# Altium footprint library ICs And Semiconductors SMD.PcbLib: 943 footprints (part 13 of 60)
Each footprint in its own frame and in the unit in brackets; x right, y up, seen from the top. Pads: shape width x height; smd on the part's side, far side on the other; paste and mask are expansions set on the pad; w line width, h text height; cw(c..) or ccw(c..) is an arc to the next point about the centre after c.
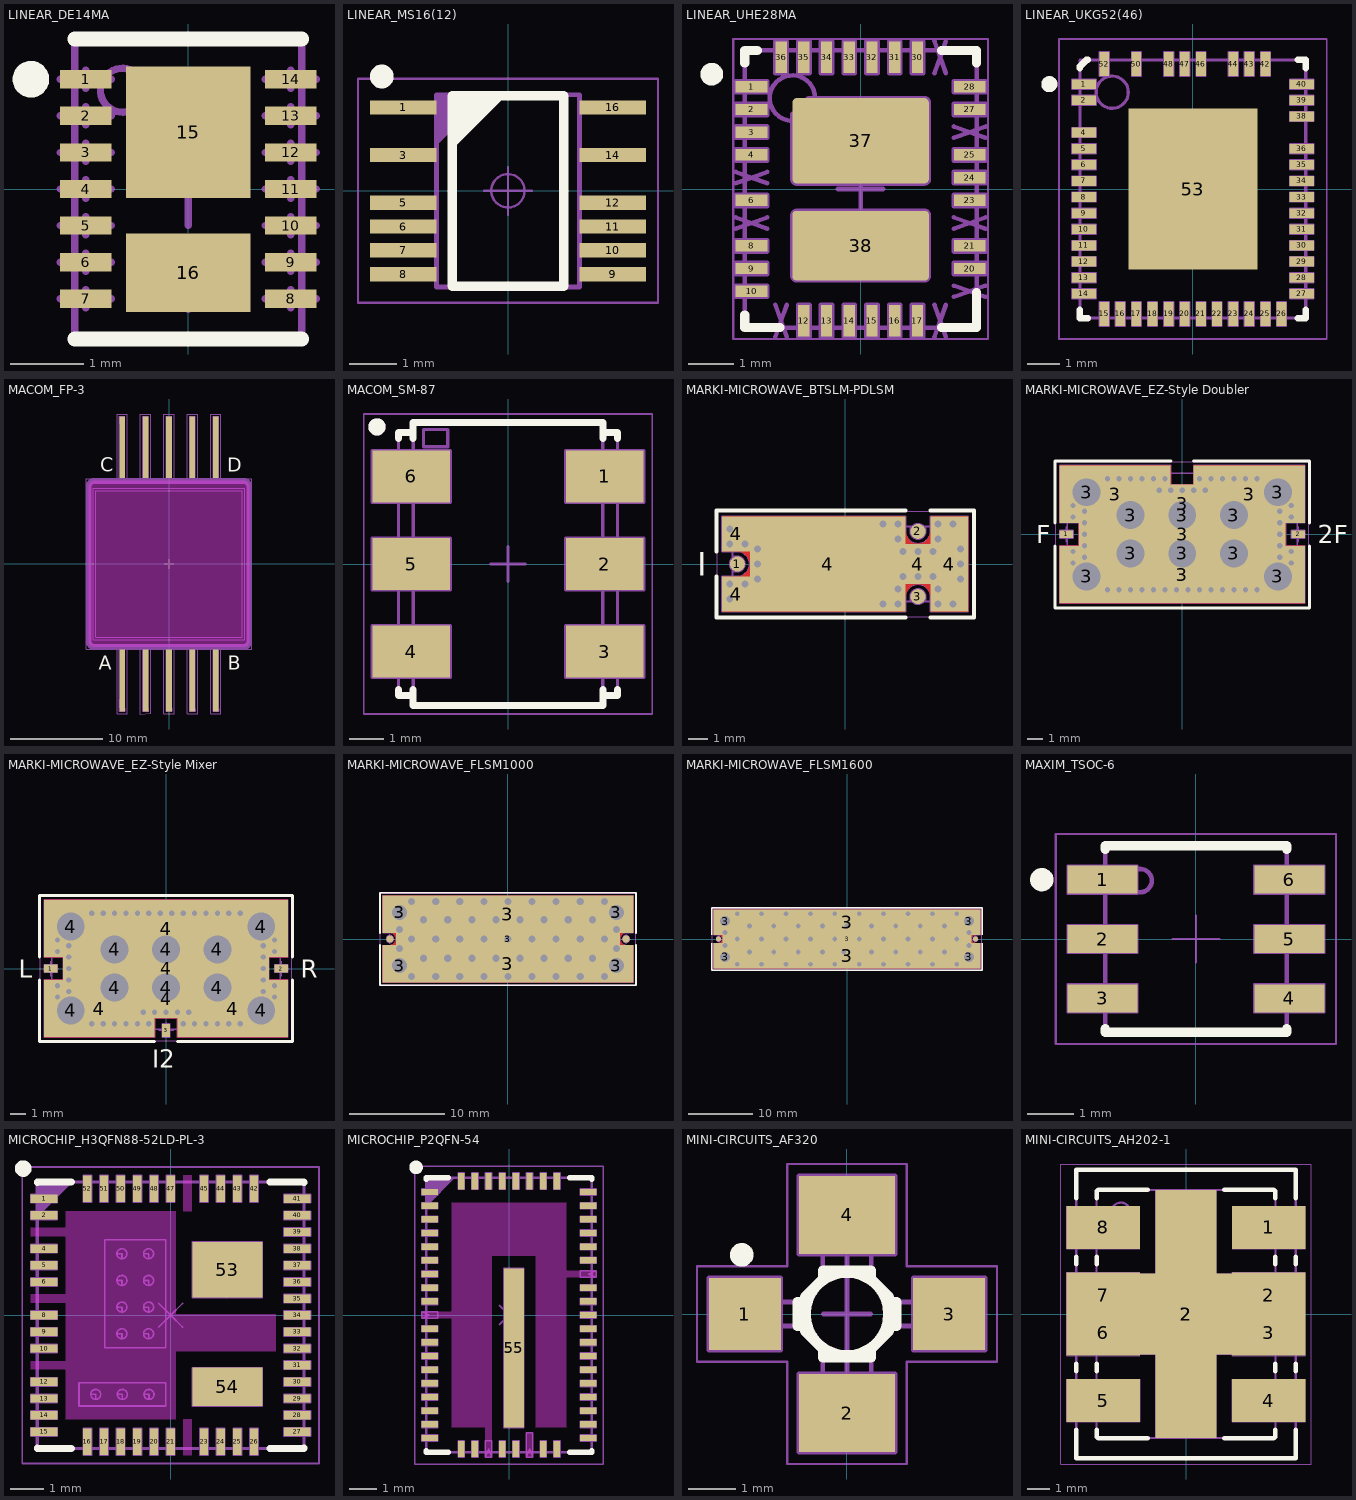
[diagram p12: the footprints below, top view; thin cyan lines are the x and y axes]

## LINEAR_DE14MA [mm] "DFN, 14-Leads, Body 3x4mm, Pitch 0.50mm, LINEAR DE14MA Package"
height 0.8
pads (16):
  rect 0.7x0.25 smd: 1(-1.4,1.5) 2(-1.4,1) 3(-1.4,0.5) 4(-1.4,0) 5(-1.4,-0.5) 6(-1.4,-1) 7(-1.4,-1.5) 8(1.4,-1.5) 9(1.4,-1) 10(1.4,-0.5) 11(1.4,0) 12(1.4,0.5) 13(1.4,1) 14(1.4,1.5)
  rect 1.7x1.8 smd: 15(0,0.778)
  rect 1.7x1.07 smd: 16(0,-1.145)
Top Overlay:
  circle w0.25: c-2.15,1.5 r0.125
  lines w0.2: -1.55,-2.05 1.55,-2.05 ; -1.55,2.05 1.55,2.05
Mechanical 8:
  lines w0.1: -1.75,-1.5 -1.4,-1.5 ; -1.75,-1 -1.4,-1 ; -1.75,-0.5 -1.4,-0.5 ; -1.75,0 -1.4,0 ; -1.75,0.5 -1.4,0.5 ; -1.75,1 -1.4,1 ; -1.75,1.5 -1.4,1.5 ; -1.4,-1.625 -1.4,-1.5 ; -1.4,-1.375 -1.4,-1.5 ; -1.4,-1.125 -1.4,-1 ; -1.4,-0.875 -1.4,-1 ; -1.4,-0.625 -1.4,-0.5 ; -1.4,-0.375 -1.4,-0.5 ; -1.4,-0.125 -1.4,0 ; -1.4,0.125 -1.4,0 ; -1.4,0.375 -1.4,0.5 ; -1.4,0.625 -1.4,0.5 ; -1.4,0.875 -1.4,1 ; -1.4,1.125 -1.4,1 ; -1.4,1.375 -1.4,1.5 ; -1.4,1.625 -1.4,1.5 ; -1.05,-1.5 -1.4,-1.5 ; -1.05,-1 -1.4,-1 ; -1.05,-0.5 -1.4,-0.5 ; -1.05,0 -1.4,0 ; -1.05,0.5 -1.4,0.5 ; -1.05,1 -1.4,1 ; -1.05,1.5 -1.4,1.5 ; -0.5,-1.145 0,-1.145 ; -0.5,0 0,0 ; -0.5,0.778 0,0.778 ; 0,-1.645 0,-1.145 ; 0,-0.5 0,0 ; 0,0.5 0,0 ; 0,1.278 0,0.778 ; 0.5,-1.145 0,-1.145 ; 0.5,0 0,0 ; 0.5,0.778 0,0.778 ; 1.05,-1.5 1.4,-1.5 ; 1.05,-1 1.4,-1 ; 1.05,-0.5 1.4,-0.5 ; 1.05,0 1.4,0 ; 1.05,0.5 1.4,0.5 ; 1.05,1 1.4,1 ; 1.05,1.5 1.4,1.5 ; 1.4,-1.625 1.4,-1.5 ; 1.4,-1.375 1.4,-1.5 ; 1.4,-1.125 1.4,-1 ; 1.4,-0.875 1.4,-1 ; 1.4,-0.625 1.4,-0.5 ; 1.4,-0.375 1.4,-0.5 ; 1.4,-0.125 1.4,0 ; 1.4,0.125 1.4,0 ; 1.4,0.375 1.4,0.5 ; 1.4,0.625 1.4,0.5 ; 1.4,0.875 1.4,1 ; 1.4,1.125 1.4,1 ; 1.4,1.375 1.4,1.5 ; 1.4,1.625 1.4,1.5 ; 1.75,-1.5 1.4,-1.5 ; 1.75,-1 1.4,-1 ; 1.75,-0.5 1.4,-0.5 ; 1.75,0 1.4,0 ; 1.75,0.5 1.4,0.5 ; 1.75,1 1.4,1 ; 1.75,1.5 1.4,1.5
Mechanical 14:
  circle w0.1: c-0.9,1.35 r0.3
  lines w0.1: -1.55,-2.05 1.55,-2.05 1.55,2.05 -1.55,2.05 -1.55,-2.05
3D body "LINEAR_DE14MA.stp": height 0.8, standoff 0, extent -1.55,-2.05 1.55,2.05

## LINEAR_MS16(12) [mm] "SOP, 0.50mm Pitch; 16 Pins with 4 Pins Removed, 3.00mm W X 4.039mm L X 1.10mm H Body, IPC Medium Density"
height 1.1
pads (12):
  rect 1.4x0.3 smd: 1(-2.2,1.75) 3(-2.2,0.75) 5(-2.2,-0.25) 6(-2.2,-0.75) 7(-2.2,-1.25) 8(-2.2,-1.75) 9(2.2,-1.75) 10(2.2,-1.25) 11(2.2,-0.75) 12(2.2,-0.25) 14(2.2,0.75) 16(2.2,1.75)
Top Overlay:
  circle w0.25: c-2.65,2.4 r0.125
  lines w0.2: -1.175,1 -0.175,2 ; -1.175,1.2 -0.375,2 ; -1.175,1.4 -0.575,2 ; -1.175,1.6 -0.775,2 ; -1.175,1.8 -0.975,2 ; -1.175,-2 1.175,-2 1.175,2 -1.175,2 -1.175,-2
Mechanical 14:
  lines w0.1: -1.5,1.019 -0.5,2.019 ; -1.5,1.12 -0.6,2.019 ; -1.5,1.219 -0.7,2.019 ; -1.5,1.32 -0.8,2.019 ; -1.5,1.419 -0.9,2.019 ; -1.5,1.519 -1,2.019 ; -1.5,1.62 -1.1,2.019 ; -1.5,1.719 -1.2,2.019 ; -1.5,1.82 -1.3,2.019 ; -1.5,1.919 -1.4,2.019 ; -1.5,-2.019 1.5,-2.019 1.5,2.019 -1.5,2.019 -1.5,-2.019
Mechanical 15:
  circle w0.05: c0,0 r0.35
  lines w0.05: -0.5,0 0.5,0 ; 0,-0.5 0,0.5 ; -3.15,-2.35 3.15,-2.35 3.15,2.35 -3.15,2.35 -3.15,-2.35
3D body "LINEAR_MS16(12).stp": height 1.1, standoff 0, extent -2.466,-2.07 2.466,2.07

## LINEAR_UHE28MA [mm] "36-Lead Plastic QFN (5mm × 6mm), LINEAR UHE Package Variation: UHE28MA"
height 0.8
pads (30):
  rect 0.7x0.25 smd: 1(-2.4,2.25) 2(-2.4,1.75) 3(-2.4,1.25) 4(-2.4,0.75) 6(-2.4,-0.25) 8(-2.4,-1.25) 9(-2.4,-1.75) 10(-2.4,-2.25) 20(2.4,-1.75) 21(2.4,-1.25) 23(2.4,-0.25) 24(2.4,0.25) 25(2.4,0.75) 27(2.4,1.75) 28(2.4,2.25)
  rect 0.25x0.7 smd: 12(-1.25,-2.9) 13(-0.75,-2.9) 14(-0.25,-2.9) 15(0.25,-2.9) 16(0.75,-2.9) 17(1.25,-2.9) 30(1.25,2.9) 31(0.75,2.9) 32(0.25,2.9) 33(-0.25,2.9) 34(-0.75,2.9) 35(-1.25,2.9) 36(-1.75,2.9)
  rrect10% 3x1.88 smd: 37(0,1.06)
  rrect10% 3x1.53 smd: 38(0,-1.245)
Top Overlay:
  circle w0.25: c-3.275,2.525 r0.125
  lines w0.2: -2.55,-2.775 -2.55,-3.05 -1.775,-3.05 ; -2.55,2.775 -2.55,3.05 -2.275,3.05 ; 1.775,-3.05 2.55,-3.05 2.55,-2.275 ; 1.775,3.05 2.55,3.05 2.55,2.775
Mechanical 8:
  drawing of 284 lines, arcs and shapes, not listed
Mechanical 14:
  circle w0.1: c-1.5,2 r0.5
  lines w0.1: -2.55,-3.05 -2.55,3.05 2.55,3.05 2.55,-3.05 -2.55,-3.05
Mechanical 15:
  lines w0.05: -2.8,-3.3 2.8,-3.3 2.8,3.3 -2.8,3.3 -2.8,-3.3
3D body "LINEAR_UHE28MA.stp": height 0.8, standoff 0, extent -2.55,-3.05 2.55,3.05

## LINEAR_UKG52(46) [mm] "QFN, 0.50mm Pitch, Rectangular, 47 Pin, 8.5mm L X 7.5mm W X 0.8mm H Body (w/thermal tab 3.9 X 4.9mm), LINEAR UKG52(46) Package"
height 0.8
pads (47):
  rect 0.75x0.3 smd: 1(-3.375,3.25) 2(-3.375,2.75) 4(-3.375,1.75) 5(-3.375,1.25) 6(-3.375,0.75) 7(-3.375,0.25) 8(-3.375,-0.25) 9(-3.375,-0.75) 10(-3.375,-1.25) 11(-3.375,-1.75) 12(-3.375,-2.25) 13(-3.375,-2.75) 14(-3.375,-3.25) 27(3.375,-3.25) 28(3.375,-2.75) 29(3.375,-2.25) 30(3.375,-1.75) 31(3.375,-1.25) 32(3.375,-0.75) 33(3.375,-0.25) 34(3.375,0.25) 35(3.375,0.75) 36(3.375,1.25) 38(3.375,2.25) 39(3.375,2.75) 40(3.375,3.25)
  rect 0.3x0.75 smd: 15(-2.75,-3.875) 16(-2.25,-3.875) 17(-1.75,-3.875) 18(-1.25,-3.875) 19(-0.75,-3.875) 20(-0.25,-3.875) 21(0.25,-3.875) 22(0.75,-3.875) 23(1.25,-3.875) 24(1.75,-3.875) 25(2.25,-3.875) 26(2.75,-3.875) 42(2.25,3.875) 43(1.75,3.875) 44(1.25,3.875) 46(0.25,3.875) 47(-0.25,3.875) 48(-0.75,3.875) 50(-1.75,3.875) 52(-2.75,3.875)
  rect 4x5 smd: 53(0,0)
Top Overlay:
  circle w0.25: c-4.45,3.25 r0.125
  lines w0.2: -3.5,-3.75 -3.5,-4 -3.25,-4 ; -3.5,3.75 -3.5,3.8 -3.3,4 -3.25,4 ; 3.25,-4 3.5,-4 3.5,-3.75 ; 3.25,4 3.5,4 3.5,3.75
Top Paste:
  region: -1.19,-1.95 1.19,-1.95 1.19,-0.27 -1.19,-0.27
  region: -1.19,0.27 1.19,0.27 1.19,1.95 -1.19,1.95
Mechanical 8:
  drawing of 276 lines, arcs and shapes, not listed
Mechanical 14:
  circle w0.1: c-2.5,3 r0.5
  lines w0.1: -3.5,-4 3.5,-4 3.5,4 -3.5,4 -3.5,-4
Mechanical 15:
  circle w0.05: c0,0 r0.35
  lines w0.05: -0.5,0 0.5,0 ; 0,-0.5 0,0.5 ; -4.15,-4.65 4.15,-4.65 4.15,4.65 -4.15,4.65 -4.15,-4.65
3D body "LINEAR_UKG52(46).stp": height 0.8, standoff 0, extent -3.5,-4 3.5,4

## MACOM_FP-3 [mm] "MACOM Case Style FP-3 - Body W 15.9 x L 15.9 H 3.8mm"
height 3.8
pads (10):
  rect 0.6x6.7 smd: 1(-5.08,12.65) 2(-2.54,12.65) 3(0,12.65) 4(2.54,12.65) 5(5.08,12.65) 6(-5.08,-12.65) 7(-2.54,-12.65) 8(0,-12.65) 9(2.54,-12.65) 10(5.08,-12.65)
Top Overlay:
  text "A" at -7.625,-11.5 h1.5
  text "B" at 6.35,-11.5 h1.5
  text "C" at -7.44,10 h1.5
  text "D" at 6.307,10 h1.5
Keep-Out Layer:
  board cut-out: -8.1,-9 -8.219,-9 -8.44,-8.909 -8.609,-8.74 -8.7,-8.519 -8.7,-8.4 -8.7,8.4 -8.7,8.519 -8.609,8.74 -8.44,8.909 -8.219,9 -8.1,9 8.1,9 8.219,9 8.44,8.909 8.609,8.74 8.7,8.519 8.7,8.4 8.7,-8.4 8.7,-8.519 8.609,-8.74 8.44,-8.909 8.219,-9 8.1,-9
Mechanical 1:
  lines w0.635: -8.7,-8.4 ccw(c-8.1,-8.4) -8.1,-9 8.1,-9 ccw(c8.1,-8.4) 8.7,-8.4 8.7,8.4 ccw(c8.1,8.4) 8.1,9 -8.1,9 ccw(c-8.1,8.4) -8.7,8.4 -8.7,-8.4
Mechanical 8:
  lines w0.1: -0.5,0 0,0 ; 0,-0.5 0,0 ; 0,0.5 0,0 ; 0.5,0 0,0 ; -5.38,-16 -4.78,-16 ; -5.38,-16 -5.38,-9.3 -4.78,-9.3 -4.78,-16 ; -5.38,-16 -5.08,-12.65 -4.78,-16 ; -5.38,16 -4.78,16 ; -5.38,16 -5.38,9.3 -4.78,9.3 -4.78,16 ; -5.38,16 -5.08,12.65 -4.78,16 ; -2.84,-16 -2.24,-16 ; -2.84,-16 -2.84,-9.3 -2.24,-9.3 -2.24,-16 ; -2.84,-16 -2.54,-12.65 -2.24,-16 ; -2.84,16 -2.24,16 ; -2.84,16 -2.84,9.3 -2.24,9.3 -2.24,16 ; -2.84,16 -2.54,12.65 -2.24,16 ; -0.3,-16 0.3,-16 ; -0.3,-16 -0.3,-9.3 0.3,-9.3 0.3,-16 ; -0.3,-16 0,-12.65 0.3,-16 ; -0.3,16 0.3,16 ; -0.3,16 -0.3,9.3 0.3,9.3 0.3,16 ; -0.3,16 0,12.65 0.3,16 ; 2.24,-16 2.84,-16 ; 2.24,-16 2.24,-9.3 2.84,-9.3 2.84,-16 ; 2.24,-16 2.54,-12.65 2.84,-16 ; 2.24,16 2.84,16 ; 2.24,16 2.24,9.3 2.84,9.3 2.84,16 ; 2.24,16 2.54,12.65 2.84,16 ; 4.78,-16 5.38,-16 ; 4.78,-16 4.78,-9.3 5.38,-9.3 5.38,-16 ; 4.78,-16 5.08,-12.65 5.38,-16 ; 4.78,16 5.38,16 ; 4.78,16 4.78,9.3 5.38,9.3 5.38,16 ; 4.78,16 5.08,12.65 5.38,16 ; -7.95,-7.95 7.95,-7.95 7.95,7.95 -7.95,7.95 -7.95,-7.95
Mechanical 14:
  lines w0.1: -8.2,-8.2 8.2,-8.2 8.2,8.2 -8.2,8.2 -8.2,-8.2
  text "C" at -5.49,4.25 h1.5
  text "D" at 4.357,4.25 h1.5
  text "A" at -5.675,-5.75 h1.5
  text "B" at 4.4,-5.75 h1.5
Mechanical 15:
  lines w0.05: -8.95,-9.25 -8.95,9.25 -5.63,9.25 -5.63,16.25 -4.53,16.25 -4.53,9.25 -3.09,9.25 -3.09,16.25 -1.99,16.25 -1.99,9.25 -0.55,9.25 -0.55,16.25 0.55,16.25 0.55,9.25 1.99,9.25 1.99,16.25 3.09,16.25 3.09,9.25 4.53,9.25 4.53,16.25 5.63,16.25 5.63,9.25 8.95,9.25 8.95,-9.25 5.63,-9.25 5.63,-16.25 4.53,-16.25 4.53,-9.25 3.09,-9.25 3.09,-16.25 1.99,-16.25 1.99,-9.25 0.55,-9.25 0.55,-16.25 -0.55,-16.25 -0.55,-9.25 -1.995,-9.25 -1.995,-16.175 -3.09,-16.273 -3.09,-9.25 -4.53,-9.25 -4.53,-16.25 -5.63,-16.25 -5.63,-9.25 -8.95,-9.25
Drill Drawing:
  lines w0.1: -7.76,-5.342 -8.7,-5 ; -7.76,-4.658 -8.7,-5 ; -5.342,-8.06 -5,-9 ; -5.342,8.06 -5,9 ; -4.658,-8.06 -5,-9 ; -4.658,8.06 -5,9 ; 0.6,-7.373 7.073,-7.373 8.524,-8.824 ; 7.618,-8.402 8.524,-8.824 ; 7.76,-5.342 8.7,-5 ; 7.76,-4.658 8.7,-5 ; 8.102,-7.918 8.524,-8.824 ; -8.7,-5 8.7,-5 ; -5,-9 -5,9
  text "4x r0.6" at 0.45,-7.075 h1
  text "17.4" at 0.542,-4.791 h1
  text "18" at -5.209,0.792 h1
3D body "MACOM_FP-3.stp": height 2.49, standoff -1.31, extent -8.2,-15.8 8.2,15.8

## MACOM_SM-87 [mm] "MACOM Case Style SM-87 - Body W 6.35 x L 8.20 H 4.85mm"
height 4.85
pads (6):
  rect 2.26x1.5 smd: 1(2.805,2.54) 2(2.805,0) 3(2.805,-2.54) 4(-2.805,-2.54) 5(-2.805,0) 6(-2.805,2.54)
Top Overlay:
  circle w0.25: c-3.8,3.975 r0.125
  lines w0.2: -3.175,-3.64 -3.175,-3.81 -2.75,-3.81 ; -3.175,3.64 -3.175,3.81 -2.75,3.81 ; -2.75,-3.64 -2.75,-4.1 2.75,-4.1 2.75,-3.64 ; -2.75,3.64 -2.75,4.1 2.75,4.1 2.75,3.64 ; 2.75,-3.81 3.175,-3.81 3.175,-3.64 ; 2.75,3.81 3.175,3.81 3.175,3.64
Mechanical 8:
  lines w0.1: -3.305,-2.54 -2.805,-2.54 ; -3.305,0 -2.805,0 ; -3.305,2.54 -2.805,2.54 ; -2.805,-3.04 -2.805,-2.54 ; -2.805,-2.04 -2.805,-2.54 ; -2.805,-0.5 -2.805,0 ; -2.805,0.5 -2.805,0 ; -2.805,2.04 -2.805,2.54 ; -2.805,3.04 -2.805,2.54 ; -2.305,-2.54 -2.805,-2.54 ; -2.305,0 -2.805,0 ; -2.305,2.54 -2.805,2.54 ; -0.5,0 0,0 ; 0,-0.5 0,0 ; 0,0.5 0,0 ; 0.5,0 0,0 ; 2.305,-2.54 2.805,-2.54 ; 2.305,0 2.805,0 ; 2.305,2.54 2.805,2.54 ; 2.805,-3.04 2.805,-2.54 ; 2.805,-2.04 2.805,-2.54 ; 2.805,-0.5 2.805,0 ; 2.805,0.5 2.805,0 ; 2.805,2.04 2.805,2.54 ; 2.805,3.04 2.805,2.54 ; 3.305,-2.54 2.805,-2.54 ; 3.305,0 2.805,0 ; 3.305,2.54 2.805,2.54 ; -3.935,-3.29 -3.935,-1.79 -1.675,-1.79 -1.675,-3.29 -3.935,-3.29 ; -3.935,-0.75 -3.935,0.75 -1.675,0.75 -1.675,-0.75 -3.935,-0.75 ; -3.935,1.79 -3.935,3.29 -1.675,3.29 -1.675,1.79 -3.935,1.79 ; 1.675,-3.29 1.675,-1.79 3.935,-1.79 3.935,-3.29 1.675,-3.29 ; 1.675,-0.75 1.675,0.75 3.935,0.75 3.935,-0.75 1.675,-0.75 ; 1.675,1.79 1.675,3.29 3.935,3.29 3.935,1.79 1.675,1.79
Mechanical 14:
  circle w0.25: c-3.8,3.975 r0.125
  lines w0.1: -3.175,-3.29 ccw(c-3.254,-2.54) -2.75,-3.101 ; -3.175,-1.79 cw(c-3.254,-2.54) -2.75,-1.979 ; -3.175,-0.75 ccw(c-3.254,0) -2.75,-0.561 ; -3.175,0.75 cw(c-3.254,0) -2.75,0.561 ; -3.175,1.79 ccw(c-3.254,2.54) -2.75,1.979 ; -3.175,3.29 cw(c-3.254,2.54) -2.75,3.101 ; -2.75,-3.81 -3.175,-3.81 -3.175,-3.04 ccw(c-3.257,-2.54) -3.175,-2.04 -3.175,-0.5 ccw(c-3.257,0) -3.175,0.5 -3.175,2.04 ccw(c-3.257,2.54) -3.175,3.04 -3.175,3.81 -2.75,3.81 ; 2.75,-3.81 3.175,-3.81 3.175,-3.04 cw(c3.257,-2.54) 3.175,-2.04 3.175,-0.5 cw(c3.257,0) 3.175,0.5 3.175,2.04 cw(c3.257,2.54) 3.175,3.04 3.175,3.81 2.75,3.81 ; 2.75,-3.101 ccw(c3.254,-2.54) 3.175,-3.29 ; 2.75,-1.979 cw(c3.254,-2.54) 3.175,-1.79 ; 2.75,-0.561 ccw(c3.254,0) 3.175,-0.75 ; 2.75,0.561 cw(c3.254,0) 3.175,0.75 ; 2.75,1.979 ccw(c3.254,2.54) 3.175,1.79 ; 2.75,3.101 cw(c3.254,2.54) 3.175,3.29 ; -2.75,-4.1 2.75,-4.1 2.75,4.1 -2.75,4.1 -2.75,-4.1 ; -2.45,3.4 -2.45,3.9 -1.75,3.9 -1.75,3.4 -2.45,3.4
Mechanical 15:
  lines w0.05: -4.185,-4.35 4.185,-4.35 4.185,4.35 -4.185,4.35 -4.185,-4.35
3D body "MACOM_SM-87.stp": height 4.85, standoff 0, extent -3.175,-4.1 3.175,4.1

## MARKI-MICROWAVE_BTSLM-PDLSM [mil] "Marki microwave BTSLM-PDLSM Style, 11.43mm L X 3.81mm W X 2.79mm H Body"
height 169.29
pads (8):
  round 30 smd: 1(-215,0) 2(145.08,65) 3(145.08,-65)
  rect 54.96x70 smd: 4(-217.52,-59.98) 4(-217.52,60)
  rect 310.04x190 smd: 4(-35.02,0)
  rect 50x80.08 smd: 4(145,0)
  rect 74.96x190 smd: 4(207.51,-0.03)
via -230,70 diameter 23.62 hole 13.78
via -230,40 diameter 23.62 hole 13.78
via -200,40 diameter 23.62 hole 13.78
via -175,30 diameter 23.62 hole 13.78
via -175,0 diameter 23.62 hole 13.78
via -175,-30 diameter 23.62 hole 13.78
via -200,-40 diameter 23.62 hole 13.78
via -230,-40 diameter 23.62 hole 13.78
via -230,-70 diameter 23.62 hole 13.78
via 75,-80 diameter 23.62 hole 13.78
via 105,-80 diameter 23.62 hole 13.78
via 105,-50 diameter 23.62 hole 13.78
via 115,-25 diameter 23.62 hole 13.78
via 145,-25 diameter 23.62 hole 13.78
via 175,-25 diameter 23.62 hole 13.78
via 185,-50 diameter 23.62 hole 13.78
via 185,-80 diameter 23.62 hole 13.78
via 215,-80 diameter 23.62 hole 13.78
via 230,-30 diameter 23.62 hole 13.78
via 230,0 diameter 23.62 hole 13.78
via 230,30 diameter 23.62 hole 13.78
via 215,80 diameter 23.62 hole 13.78
via 185,80 diameter 23.62 hole 13.78
via 185,50 diameter 23.62 hole 13.78
via 175,25 diameter 23.62 hole 13.78
via 145,25 diameter 23.62 hole 13.78
via 115,25 diameter 23.62 hole 13.78
via 105,50 diameter 23.62 hole 13.78
via 105,80 diameter 23.62 hole 13.78
via 75,80 diameter 23.62 hole 13.78
Top Layer:
  region: -245,-24.96 -214.95,-24.96 -210.08,-24.48 -201.08,-20.75 -194.19,-13.87 -190.47,-4.87 -190.47,4.87 -194.19,13.87 -201.08,20.75 -210.08,24.48 -214.95,24.96 -225,24.96 -245,25 -245,95 120,95 120,65 120.48,60.12 124.22,51.11 131.11,44.21 140.12,40.48 149.88,40.48 158.89,44.21 165.79,51.11 169.52,60.12 170,65 170,95 245,95 245,-95 170.04,-95 170.04,-64.95 169.56,-60.08 165.83,-51.08 158.95,-44.2 149.95,-40.47 140.21,-40.47 131.21,-44.2 124.33,-51.08 120.6,-60.08 120.12,-64.95 120.12,-75 120,-95 -245,-95
Top Overlay:
  lines w7.87: -256.81,-24.96 -256.81,-106.81 120,-106.81 ; -256.81,25 -256.81,106.81 120,106.81 ; 170,106.81 256.81,106.81 256.81,-106.81 170.04,-106.81
  text "I" at -295.28,-23.62 h47.24
Mechanical 8:
  drawing of 170 lines, arcs and shapes, not listed
Mechanical 14:
  circle w3.94: c-215,0 r3.94
  circle w3.94: c218.11,-62.99 r3.94
  circle w3.94: c218.11,0 r3.94
  circle w3.94: c218.11,62.99 r3.94
  circle w3.94: c145.08,65 r3.94
  circle w3.94: c145.08,-65 r3.94
  lines w3.94: -225,-24.96 -214.95,-24.96 ccw(c-215,0) -214.95,24.96 -225,24.96 ; -225,-14.96 -214.96,-14.96 ccw(c-215,0) -214.96,14.96 -225,14.96 ; 120.12,-75 120.12,-64.95 cw(c145.08,-65) 170.04,-64.95 170.04,-75 ; 120.12,75 120,65 ccw(c145,65) 170,65 170,75 ; 130.12,-75 130.12,-64.96 cw(c145.08,-65) 160.04,-64.96 160.04,-75 ; 130.12,75 130.12,64.96 ccw(c145.08,65) 160.04,64.96 160.04,75 205,75 205,-75 ; -225,-75 -225,75 225,75 225,-75 -225,-75
  text "I" at -295.28,-23.62 h47.24
Mechanical 15:
  lines w1.97: -254.84,-104.84 -254.84,104.84 254.84,104.84 254.84,-104.84 -254.84,-104.84
Drill Drawing:
  lines w3.94: -245,-95 245,-95 245,95 -245,95 -245,-95
  text "(D=0.35mm)" at -145.67,-62.99 h23.62
  text "And Capped" at -145.67,19.68 h23.62
  text "Via Area" at -145.67,-23.62 h23.62
  text "Filled" at -145.67,59.06 h23.62
3D body "MARKI-MICROWAVE_BTSLM-PDLSM.stp": height 110, standoff 0, extent -224.99,-74.99 225.01,75

## MARKI-MICROWAVE_EZ-Style Doubler [mm] "Marki microwave EZ Style Doubler Outline, 15.24mm L X 8.13mm W X 4.3mm H Body"
height 4.3
pads (17):
  rect 0.889x0.508 smd: 1(-7.683,0) 2(7.684,0)
  round 2.35 hole 1.85: 3(-6.35,-2.794) 3(-6.35,2.794) 3(-3.429,-1.27) 3(-3.429,1.27) 3(0,-1.27) 3(0,1.27) 3(3.429,-1.27) 3(3.429,1.27) 3(6.35,-2.794) 3(6.35,2.794)
  rect 7.366x3.81 smd: 3(-4.445,2.667) 3(4.445,2.667)
  rect 16.256x3.81 smd: 3(0,-2.667)
  rect 13.716x1.524 smd: 3(0,0)
  rect 1.524x2.54 smd: 3(0,2.032)
via -7.239,1.905 diameter 0.6 hole 0.35
via -7.239,1.143 diameter 0.6 hole 0.35
via -6.477,0.762 diameter 0.6 hole 0.35
via -6.477,0 diameter 0.6 hole 0.35
via -6.477,-0.762 diameter 0.6 hole 0.35
via -7.239,-1.143 diameter 0.6 hole 0.35
via -6.477,-1.524 diameter 0.6 hole 0.35
via -7.239,-1.905 diameter 0.6 hole 0.35
via -4.953,-3.683 diameter 0.6 hole 0.35
via -4.191,-3.683 diameter 0.6 hole 0.35
via -3.429,-3.683 diameter 0.6 hole 0.35
via -2.667,-3.683 diameter 0.6 hole 0.35
via -1.905,-3.683 diameter 0.6 hole 0.35
via -1.143,-3.683 diameter 0.6 hole 0.35
via -0.381,-3.683 diameter 0.6 hole 0.35
via 0.381,-3.683 diameter 0.6 hole 0.35
via 1.143,-3.683 diameter 0.6 hole 0.35
via 1.905,-3.683 diameter 0.6 hole 0.35
via 2.667,-3.683 diameter 0.6 hole 0.35
via 3.429,-3.683 diameter 0.6 hole 0.35
via 4.191,-3.683 diameter 0.6 hole 0.35
via 4.953,-3.683 diameter 0.6 hole 0.35
via 7.239,-1.905 diameter 0.6 hole 0.35
via 6.477,-1.524 diameter 0.6 hole 0.35
via 7.239,-1.143 diameter 0.6 hole 0.35
via 6.477,-0.762 diameter 0.6 hole 0.35
via 6.477,0 diameter 0.6 hole 0.35
via 6.477,0.762 diameter 0.6 hole 0.35
via 6.477,1.524 diameter 0.6 hole 0.35
via 7.239,1.143 diameter 0.6 hole 0.35
via 7.239,1.905 diameter 0.6 hole 0.35
via 4.953,3.683 diameter 0.6 hole 0.35
via 4.191,3.683 diameter 0.6 hole 0.35
via 3.429,3.683 diameter 0.6 hole 0.35
via 2.667,3.683 diameter 0.6 hole 0.35
via 1.905,3.683 diameter 0.6 hole 0.35
via 1.143,3.683 diameter 0.6 hole 0.35
via 1.524,2.921 diameter 0.6 hole 0.35
via 0.762,2.921 diameter 0.6 hole 0.35
via 0,2.921 diameter 0.6 hole 0.35
via -0.762,2.921 diameter 0.6 hole 0.35
via -1.524,2.921 diameter 0.6 hole 0.35
via -1.143,3.683 diameter 0.6 hole 0.35
via -1.905,3.683 diameter 0.6 hole 0.35
via -2.667,3.683 diameter 0.6 hole 0.35
via -3.429,3.683 diameter 0.6 hole 0.35
via -4.191,3.683 diameter 0.6 hole 0.35
via -4.953,3.683 diameter 0.6 hole 0.35
via -6.477,1.524 diameter 0.6 hole 0.35
Top Layer:
  region: -8.128,-0.762 -6.858,-0.762 -6.858,0.762 -8.128,0.762 -8.128,4.572 -0.762,4.572 -0.762,3.302 0.762,3.302 0.762,4.572 8.128,4.572 8.128,0.762 6.858,0.762 6.858,-0.762 8.128,-0.762 8.128,-4.572 -8.128,-4.572
Top Overlay:
  lines w0.2: -8.428,-0.762 -8.428,-4.872 8.428,-4.872 8.428,-0.762 ; -8.428,0.762 -8.428,4.872 -0.762,4.872 ; 0.762,4.872 8.428,4.872 8.428,0.762
  text "F" at -9.7,-0.6 h1.2
  text "2F" at 9,-0.6 h1.2
Mechanical 8:
  drawing of 285 lines, arcs and shapes, not listed
Mechanical 14:
  circle w0.1: c-6.35,2.794 r0.925
  circle w0.1: c6.35,-2.794 r0.925
  circle w0.1: c-6.35,-2.794 r1.2
  circle w0.1: c6.35,2.794 r1.2
  lines w0.1: -7.62,-1.394 -6.35,-1.394 cw(c-6.35,-2.794) -4.95,-2.794 -4.95,-4.064 ; -7.62,-1.394 -7.62,1.394 ; -7.62,-1.394 -7.62,-2.794 ccw(c-6.35,-2.794) -6.35,-4.064 -4.95,-4.064 ; -7.62,1.394 -7.62,2.794 cw(c-6.35,2.794) -6.35,4.064 -4.95,4.064 ; -7.62,1.394 -6.35,1.394 ccw(c-6.35,2.794) -4.95,2.794 -4.95,4.064 ; -4.95,-4.064 4.95,-4.064 ; -4.95,4.064 4.95,4.064 ; 4.95,-4.064 6.35,-4.064 ccw(c6.35,-2.794) 7.62,-2.794 7.62,-1.394 ; 4.95,-4.064 4.95,-2.794 cw(c6.35,-2.794) 6.35,-1.394 7.62,-1.394 ; 4.95,4.064 4.95,2.794 ccw(c6.35,2.794) 6.35,1.394 7.62,1.394 ; 4.95,4.064 6.35,4.064 cw(c6.35,2.794) 7.62,2.794 7.62,1.394 ; 7.62,-1.394 7.62,1.394 ; -7.123,-3.24 -7.123,-2.348 -6.35,-1.902 -5.577,-2.348 -5.577,-3.24 -6.35,-3.686 -7.123,-3.24 ; 5.577,2.348 5.577,3.24 6.35,3.686 7.123,3.24 7.123,2.348 6.35,1.902 5.577,2.348
  text "2F" at 9,-0.6 h1.2